# Altium schematic symbol library jlcpcb_2025_04_inductors_extended_0805.schlib: 882 symbols (part 1 of 5) (continued)
## BKW0805UCR39JGT
designator L?  Inductance: 390nH
Inductor, 390nH, ±5%, 1.5Ω, 290mA, SMD 0805; Manufacturer: FH-BK(Guangdong Fenghua Bangke Elec); Manufacturer Part Number: BKW0805UCR39JGT; Package Size: 0805; JLCPCB Basic Part: No; JLCPCB Part Number: C98544; Supplier 1: LCSC; Category: Inductors; Supplier Part Number 1: C98544; Tolerance: ±5%; Rated Current: 290mA; DC Resistance: 1.5Ω; RoHS: Yes; ComponentLink1Description: Datasheet; ComponentLink1URL: https://wmsc.lcsc.com/wmsc/upload/file/pdf/v2/lcsc/2304140030_FH-BK-Guangdong-Fenghua-Bangke-Elec-BKW0805UCR39JGT_C98544.pdf; ComponentLink2Description: JLCPCB Part URL; ComponentLink2URL: https://jlcpcb.com/partdetail/C98544; ComponentLink3Description: LCSC Part URL; ComponentLink3URL: https://lcsc.com/product-detail/Inductors-SMD_FH-BKGuangdong-Fenghua-Bangke-Elec-FH-BKGuangdong-Fenghua-Bangke-Elec-BKW0805UCR39JGT_C98544.html
footprint IND-0805 (0805 (2012M) Inductor)
pins: 1, 2

## BKW0805UCR47JGT
designator L?  Inductance: 470nH
Inductor, 470nH, ±5%, 2Ω, 250mA, SMD 0805; Manufacturer: FH-BK(Guangdong Fenghua Bangke Elec); Manufacturer Part Number: BKW0805UCR47JGT; Package Size: 0805; JLCPCB Basic Part: No; JLCPCB Part Number: C316239; Supplier 1: LCSC; Category: Inductors; Supplier Part Number 1: C316239; Tolerance: ±5%; Rated Current: 250mA; DC Resistance: 2Ω; RoHS: Yes; ComponentLink1Description: Datasheet; ComponentLink1URL: https://wmsc.lcsc.com/wmsc/upload/file/pdf/v2/lcsc/2304140030_FH-BK-Guangdong-Fenghua-Bangke-Elec-BKW0805UCR47JGT_C316239.pdf; ComponentLink2Description: JLCPCB Part URL; ComponentLink2URL: https://jlcpcb.com/partdetail/C316239; ComponentLink3Description: LCSC Part URL; ComponentLink3URL: https://lcsc.com/product-detail/Inductors-SMD_FH-BKGuangdong-Fenghua-Bangke-Elec-FH-BKGuangdong-Fenghua-Bangke-Elec-BKW0805UCR47JGT_C316239.html
footprint IND-0805 (0805 (2012M) Inductor)
pins: 1, 2

## BKW0805UCR56JGT
designator L?  Inductance: 560nH
Inductor, 560nH, ±5%, 1.9Ω, 230mA, SMD 0805; Manufacturer: FH-BK(Guangdong Fenghua Bangke Elec); Manufacturer Part Number: BKW0805UCR56JGT; Package Size: 0805; JLCPCB Basic Part: No; JLCPCB Part Number: C37297; Supplier 1: LCSC; Category: Inductors; Supplier Part Number 1: C37297; Tolerance: ±5%; Rated Current: 230mA; DC Resistance: 1.9Ω; RoHS: Yes; ComponentLink1Description: Datasheet; ComponentLink2Description: JLCPCB Part URL; ComponentLink2URL: https://jlcpcb.com/partdetail/C37297; ComponentLink3Description: LCSC Part URL; ComponentLink3URL: https://lcsc.com/product-detail/Inductors-SMD_FH-BKGuangdong-Fenghua-Bangke-Elec-FH-BKGuangdong-Fenghua-Bangke-Elec-BKW0805UCR56JGT_C37297.html
footprint IND-0805 (0805 (2012M) Inductor)
pins: 1, 2

## BKW0805UCR68JGT
designator L?  Inductance: 680nH
Inductor, 680nH, ±5%, 2.1Ω, 190mA, SMD 0805; Manufacturer: FH-BK(Guangdong Fenghua Bangke Elec); Manufacturer Part Number: BKW0805UCR68JGT; Package Size: 0805; JLCPCB Basic Part: No; JLCPCB Part Number: C361663; Supplier 1: LCSC; Category: Inductors; Supplier Part Number 1: C361663; Tolerance: ±5%; Rated Current: 190mA; DC Resistance: 2.1Ω; RoHS: Yes; ComponentLink1Description: Datasheet; ComponentLink1URL: https://wmsc.lcsc.com/wmsc/upload/file/pdf/v2/lcsc/2304140030_FH-BK-Guangdong-Fenghua-Bangke-Elec-BKW0805UCR68JGT_C361663.pdf; ComponentLink2Description: JLCPCB Part URL; ComponentLink2URL: https://jlcpcb.com/partdetail/C361663; ComponentLink3Description: LCSC Part URL; ComponentLink3URL: https://lcsc.com/product-detail/Inductors-SMD_FH-BKGuangdong-Fenghua-Bangke-Elec-FH-BKGuangdong-Fenghua-Bangke-Elec-BKW0805UCR68JGT_C361663.html
footprint IND-0805 (0805 (2012M) Inductor)
pins: 1, 2

## BKW0805UCR82JST
designator L?  Inductance: 820nH
Inductor, 820nH, ±5%, 180mA, SMD 0805; Manufacturer: FH-BK(Guangdong Fenghua Bangke Elec); Manufacturer Part Number: BKW0805UCR82JST; Package Size: 0805; JLCPCB Basic Part: No; JLCPCB Part Number: C243117; Supplier 1: LCSC; Category: Inductors; Supplier Part Number 1: C243117; Tolerance: ±5%; Rated Current: 180mA; RoHS: Yes; ComponentLink1Description: Datasheet; ComponentLink2Description: JLCPCB Part URL; ComponentLink2URL: https://jlcpcb.com/partdetail/C243117; ComponentLink3Description: LCSC Part URL; ComponentLink3URL: https://lcsc.com/product-detail/Inductors-SMD_FH-BKGuangdong-Fenghua-Bangke-Elec-FH-BKGuangdong-Fenghua-Bangke-Elec-BKW0805UCR82JST_C243117.html
footprint IND-0805 (0805 (2012M) Inductor)
pins: 1, 2

## BKW0805UF2R7KST
designator L?  Inductance: 2.7uH
Inductor, 2.7uH, ±10%, 1.7Ω, 320mA, SMD 0805; Manufacturer: FH-BK(Guangdong Fenghua Bangke Elec); Manufacturer Part Number: BKW0805UF2R7KST; Package Size: 0805; JLCPCB Basic Part: No; JLCPCB Part Number: C207574; Supplier 1: LCSC; Category: Inductors; Supplier Part Number 1: C207574; Tolerance: ±10%; Rated Current: 320mA; DC Resistance: 1.7Ω; RoHS: Yes; ComponentLink1Description: Datasheet; ComponentLink1URL: https://wmsc.lcsc.com/wmsc/upload/file/pdf/v2/lcsc/2304140030_FH-BK-Guangdong-Fenghua-Bangke-Elec-BKW0805UF2R7KST_C207574.pdf; ComponentLink2Description: JLCPCB Part URL; ComponentLink2URL: https://jlcpcb.com/partdetail/C207574; ComponentLink3Description: LCSC Part URL; ComponentLink3URL: https://lcsc.com/product-detail/Inductors-SMD_FH-BKGuangdong-Fenghua-Bangke-Elec-FH-BKGuangdong-Fenghua-Bangke-Elec-BKW0805UF2R7KST_C207574.html
footprint IND-0805 (0805 (2012M) Inductor)
pins: 1, 2

## BKW0805UF8R2KGT
designator L?  Inductance: 8.2uH
Inductor, 8.2uH, ±10%, 3Ω, 180mA, SMD 0805; Manufacturer: FH-BK(Guangdong Fenghua Bangke Elec); Manufacturer Part Number: BKW0805UF8R2KGT; Package Size: 0805; JLCPCB Basic Part: No; JLCPCB Part Number: C207573; Supplier 1: LCSC; Category: Inductors; Supplier Part Number 1: C207573; Tolerance: ±10%; Rated Current: 180mA; DC Resistance: 3Ω; RoHS: Yes; ComponentLink1Description: Datasheet; ComponentLink1URL: https://wmsc.lcsc.com/wmsc/upload/file/pdf/v2/lcsc/2304140030_FH-BK-Guangdong-Fenghua-Bangke-Elec-BKW0805UF8R2KGT_C207573.pdf; ComponentLink2Description: JLCPCB Part URL; ComponentLink2URL: https://jlcpcb.com/partdetail/C207573; ComponentLink3Description: LCSC Part URL; ComponentLink3URL: https://lcsc.com/product-detail/Inductors-SMD_FH-BKGuangdong-Fenghua-Bangke-Elec-FH-BKGuangdong-Fenghua-Bangke-Elec-BKW0805UF8R2KGT_C207573.html
footprint IND-0805 (0805 (2012M) Inductor)
pins: 1, 2

## BKW0805UF220KST
designator L?  Inductance: 22uH
Inductor, 22uH, ±10%, 6Ω, 80mA, SMD 0805; Manufacturer: FH-BK(Guangdong Fenghua Bangke Elec); Manufacturer Part Number: BKW0805UF220KST; Package Size: 0805; JLCPCB Basic Part: No; JLCPCB Part Number: C112609; Supplier 1: LCSC; Category: Inductors; Supplier Part Number 1: C112609; Tolerance: ±10%; Rated Current: 80mA; DC Resistance: 6Ω; RoHS: Yes; ComponentLink1Description: Datasheet; ComponentLink1URL: https://wmsc.lcsc.com/wmsc/upload/file/pdf/v2/lcsc/2304140030_FH-BK-Guangdong-Fenghua-Bangke-Elec-BKW0805UF220KST_C112609.pdf; ComponentLink2Description: JLCPCB Part URL; ComponentLink2URL: https://jlcpcb.com/partdetail/C112609; ComponentLink3Description: LCSC Part URL; ComponentLink3URL: https://lcsc.com/product-detail/Inductors-SMD_FH-BKGuangdong-Fenghua-Bangke-Elec-FH-BKGuangdong-Fenghua-Bangke-Elec-BKW0805UF220KST_C112609.html
footprint IND-0805 (0805 (2012M) Inductor)
pins: 1, 2

## BRL2012T1R0M
designator L?  Inductance: 1uH
Inductor, 1uH, ±20%, 175.5mΩ, 850mA, SMD 0805; Manufacturer: Taiyo Yuden; Manufacturer Part Number: BRL2012T1R0M; Package Size: 0805; JLCPCB Basic Part: No; JLCPCB Part Number: C92973; Supplier 1: LCSC; Category: Inductors; Supplier Part Number 1: C92973; Tolerance: ±20%; Rated Current: 850mA; DC Resistance: 175.5mΩ; RoHS: Yes; ComponentLink1Description: Datasheet; ComponentLink1URL: https://wmsc.lcsc.com/wmsc/upload/file/pdf/v2/lcsc/1810091458_Taiyo-Yuden-BRL2012T1R0M_C92973.pdf; ComponentLink2Description: JLCPCB Part URL; ComponentLink2URL: https://jlcpcb.com/partdetail/C92973; ComponentLink3Description: LCSC Part URL; ComponentLink3URL: https://lcsc.com/product-detail/Inductors-SMD_Taiyo-Yuden-Taiyo-Yuden-BRL2012T1R0M_C92973.html
footprint IND-0805 (0805 (2012M) Inductor)
pins: 1, 2

## BRL2012T4R7M
designator L?  Inductance: 4.7uH
Inductor, 4.7uH, ±20%, 715mΩ, 340mA, SMD 0805; Manufacturer: Taiyo Yuden; Manufacturer Part Number: BRL2012T4R7M; Self-Resonant Frequency: 150MHz; Package Size: 0805; JLCPCB Basic Part: No; JLCPCB Part Number: C92975; Supplier 1: LCSC; Category: Inductors; Supplier Part Number 1: C92975; Tolerance: ±20%; Rated Current: 340mA; Saturation Current: 340mA; DC Resistance: 715mΩ; RoHS: Yes; ComponentLink1Description: Datasheet; ComponentLink1URL: https://wmsc.lcsc.com/wmsc/upload/file/pdf/v2/lcsc/1810091458_Taiyo-Yuden-BRL2012T4R7M_C92975.pdf; ComponentLink2Description: JLCPCB Part URL; ComponentLink2URL: https://jlcpcb.com/partdetail/C92975; ComponentLink3Description: LCSC Part URL; ComponentLink3URL: https://lcsc.com/product-detail/Inductors-SMD_Taiyo-Yuden-Taiyo-Yuden-BRL2012T4R7M_C92975.html
footprint IND-0805 (0805 (2012M) Inductor)
pins: 1, 2

## BRL2012T100M
designator L?  Inductance: 10uH
Inductor, 10uH, ±20%, 1.105Ω, SMD 0805; Manufacturer: Taiyo Yuden; Manufacturer Part Number: BRL2012T100M; Saturation Current: 270mA; Package Size: 0805; JLCPCB Basic Part: No; JLCPCB Part Number: C92971; Supplier 1: LCSC; Category: Inductors; Supplier Part Number 1: C92971; Tolerance: ±20%; DC Resistance: 1.105Ω; RoHS: Yes; ComponentLink1Description: Datasheet; ComponentLink1URL: https://wmsc.lcsc.com/wmsc/upload/file/pdf/v2/lcsc/2201242300_Taiyo-Yuden-BRL2012T100M_C92971.pdf; ComponentLink2Description: JLCPCB Part URL; ComponentLink2URL: https://jlcpcb.com/partdetail/C92971; ComponentLink3Description: LCSC Part URL; ComponentLink3URL: https://lcsc.com/product-detail/Power-Inductors_Taiyo-Yuden-Taiyo-Yuden-BRL2012T100M_C92971.html
footprint IND-0805 (0805 (2012M) Inductor)
pins: 1, 2

## BRL2012T150M
designator L?  Inductance: 15uH
Inductor, 15uH, ±20%, 1.3Ω, 220mA, SMD 0805; Manufacturer: Taiyo Yuden; Manufacturer Part Number: BRL2012T150M; Self-Resonant Frequency: 15MHz; Package Size: 0805; JLCPCB Basic Part: No; JLCPCB Part Number: C92972; Supplier 1: LCSC; Category: Inductors; Supplier Part Number 1: C92972; Tolerance: ±20%; Rated Current: 220mA; Saturation Current: 220mA; DC Resistance: 1.3Ω; RoHS: Yes; ComponentLink1Description: Datasheet; ComponentLink1URL: https://wmsc.lcsc.com/wmsc/upload/file/pdf/v2/lcsc/1810091421_Taiyo-Yuden-BRL2012T150M_C92972.pdf; ComponentLink2Description: JLCPCB Part URL; ComponentLink2URL: https://jlcpcb.com/partdetail/C92972; ComponentLink3Description: LCSC Part URL; ComponentLink3URL: https://lcsc.com/product-detail/Inductors-SMD_Taiyo-Yuden-Taiyo-Yuden-BRL2012T150M_C92972.html
footprint IND-0805 (0805 (2012M) Inductor)
pins: 1, 2

## BRL2012TR47M
designator L?  Inductance: 470nH
Inductor, 470nH, ±20%, 90mΩ, 1.05A, SMD 0805; Manufacturer: Taiyo Yuden; Manufacturer Part Number: BRL2012TR47M; Saturation Current: 1.1A; Self-Resonant Frequency: 350MHz; Package Size: 0805; JLCPCB Basic Part: No; JLCPCB Part Number: C223135; Supplier 1: LCSC; Category: Inductors; Supplier Part Number 1: C223135; Tolerance: ±20%; Rated Current: 1.05A; DC Resistance: 90mΩ; RoHS: Yes; ComponentLink1Description: Datasheet; ComponentLink1URL: https://wmsc.lcsc.com/wmsc/upload/file/pdf/v2/lcsc/1912111437_Taiyo-Yuden-BRL2012TR47M_C223135.pdf; ComponentLink2Description: JLCPCB Part URL; ComponentLink2URL: https://jlcpcb.com/partdetail/C223135; ComponentLink3Description: LCSC Part URL; ComponentLink3URL: https://lcsc.com/product-detail/Inductors-SMD_Taiyo-Yuden-Taiyo-Yuden-BRL2012TR47M_C223135.html
footprint IND-0805 (0805 (2012M) Inductor)
pins: 1, 2

## CB2012T1R0M
designator L?  Inductance: 1uH
Inductor, 1uH, ±20%, 150mΩ, 500mA, SMD 0805; Manufacturer: Taiyo Yuden; Manufacturer Part Number: CB2012T1R0M; Self-Resonant Frequency: 100MHz; Package Size: 0805; JLCPCB Basic Part: No; JLCPCB Part Number: C223166; Supplier 1: LCSC; Category: Inductors; Supplier Part Number 1: C223166; Tolerance: ±20%; Rated Current: 500mA; Saturation Current: 500mA; DC Resistance: 150mΩ; RoHS: Yes; ComponentLink1Description: Datasheet; ComponentLink1URL: https://wmsc.lcsc.com/wmsc/upload/file/pdf/v2/lcsc/2304140030_Taiyo-Yuden-CB2012T1R0M_C223166.pdf; ComponentLink2Description: JLCPCB Part URL; ComponentLink2URL: https://jlcpcb.com/partdetail/C223166; ComponentLink3Description: LCSC Part URL; ComponentLink3URL: https://lcsc.com/product-detail/Inductors-SMD_Taiyo-Yuden-Taiyo-Yuden-CB2012T1R0M_C223166.html
footprint IND-0805 (0805 (2012M) Inductor)
pins: 1, 2

## CB2012T2R2M
designator L?  Inductance: 2.2uH
Inductor, 2.2uH, ±20%, 299mΩ, 410mA, SMD 0805; Manufacturer: Taiyo Yuden; Manufacturer Part Number: CB2012T2R2M; Package Size: 0805; JLCPCB Basic Part: No; JLCPCB Part Number: C90311; Supplier 1: LCSC; Category: Inductors; Supplier Part Number 1: C90311; Tolerance: ±20%; Rated Current: 410mA; DC Resistance: 299mΩ; RoHS: Yes; ComponentLink1Description: Datasheet; ComponentLink1URL: https://wmsc.lcsc.com/wmsc/upload/file/pdf/v2/lcsc/2304140030_Taiyo-Yuden-CB2012T2R2M_C90311.pdf; ComponentLink2Description: JLCPCB Part URL; ComponentLink2URL: https://jlcpcb.com/partdetail/C90311; ComponentLink3Description: LCSC Part URL; ComponentLink3URL: https://lcsc.com/product-detail/Inductors-SMD_Taiyo-Yuden-Taiyo-Yuden-CB2012T2R2M_C90311.html
footprint IND-0805 (0805 (2012M) Inductor)
pins: 1, 2

## CB2012T4R7M
designator L?  Inductance: 4.7uH
Inductor, 4.7uH, ±20%, 520mΩ, 300mA, SMD 0805; Manufacturer: Taiyo Yuden; Manufacturer Part Number: CB2012T4R7M; Package Size: 0805; JLCPCB Basic Part: No; JLCPCB Part Number: C90313; Supplier 1: LCSC; Category: Inductors; Supplier Part Number 1: C90313; Tolerance: ±20%; Rated Current: 300mA; DC Resistance: 520mΩ; RoHS: Yes; ComponentLink1Description: Datasheet; ComponentLink1URL: https://wmsc.lcsc.com/wmsc/upload/file/pdf/v2/lcsc/2304140030_Taiyo-Yuden-CB2012T4R7M_C90313.pdf; ComponentLink2Description: JLCPCB Part URL; ComponentLink2URL: https://jlcpcb.com/partdetail/C90313; ComponentLink3Description: LCSC Part URL; ComponentLink3URL: https://lcsc.com/product-detail/Inductors-SMD_Taiyo-Yuden-Taiyo-Yuden-CB2012T4R7M_C90313.html
footprint IND-0805 (0805 (2012M) Inductor)
pins: 1, 2

## CB2012T100M
designator L?  Inductance: 10uH
Inductor, 10uH, ±20%, 910mΩ, 190mA, SMD 0805; Manufacturer: Taiyo Yuden; Manufacturer Part Number: CB2012T100M; Package Size: 0805; JLCPCB Basic Part: No; JLCPCB Part Number: C90312; Supplier 1: LCSC; Category: Inductors; Supplier Part Number 1: C90312; Tolerance: ±20%; Rated Current: 190mA; DC Resistance: 910mΩ; RoHS: Yes; ComponentLink1Description: Datasheet; ComponentLink1URL: https://wmsc.lcsc.com/wmsc/upload/file/pdf/v2/lcsc/2304140030_Taiyo-Yuden-CB2012T100M_C90312.pdf; ComponentLink2Description: JLCPCB Part URL; ComponentLink2URL: https://jlcpcb.com/partdetail/C90312; ComponentLink3Description: LCSC Part URL; ComponentLink3URL: https://lcsc.com/product-detail/Inductors-SMD_Taiyo-Yuden-Taiyo-Yuden-CB2012T100M_C90312.html
footprint IND-0805 (0805 (2012M) Inductor)
pins: 1, 2

## CB2012T470M
designator L?  Inductance: 47uH
Inductor, 47uH, ±20%, 4.81Ω, 90mA, SMD 0805; Manufacturer: Taiyo Yuden; Manufacturer Part Number: CB2012T470M; Package Size: 0805; JLCPCB Basic Part: No; JLCPCB Part Number: C90314; Supplier 1: LCSC; Category: Inductors; Supplier Part Number 1: C90314; Tolerance: ±20%; Rated Current: 90mA; DC Resistance: 4.81Ω; RoHS: Yes; ComponentLink1Description: Datasheet; ComponentLink1URL: https://wmsc.lcsc.com/wmsc/upload/file/pdf/v2/lcsc/2304140030_Taiyo-Yuden-CB2012T470M_C90314.pdf; ComponentLink2Description: JLCPCB Part URL; ComponentLink2URL: https://jlcpcb.com/partdetail/C90314; ComponentLink3Description: LCSC Part URL; ComponentLink3URL: https://lcsc.com/product-detail/Inductors-SMD_Taiyo-Yuden-Taiyo-Yuden-CB2012T470M_C90314.html
footprint IND-0805 (0805 (2012M) Inductor)
pins: 1, 2

## CBC2012T1R0M
designator L?  Inductance: 1uH
Inductor, 1uH, ±20%, 247mΩ, 700mA, SMD 0805; Manufacturer: Taiyo Yuden; Manufacturer Part Number: CBC2012T1R0M; Package Size: 0805; JLCPCB Basic Part: No; JLCPCB Part Number: C92976; Supplier 1: LCSC; Category: Inductors; Supplier Part Number 1: C92976; Tolerance: ±20%; Rated Current: 700mA; DC Resistance: 247mΩ; RoHS: Yes; ComponentLink1Description: Datasheet; ComponentLink1URL: https://wmsc.lcsc.com/wmsc/upload/file/pdf/v2/lcsc/1810091458_Taiyo-Yuden-CBC2012T1R0M_C92976.pdf; ComponentLink2Description: JLCPCB Part URL; ComponentLink2URL: https://jlcpcb.com/partdetail/C92976; ComponentLink3Description: LCSC Part URL; ComponentLink3URL: https://lcsc.com/product-detail/Inductors-SMD_Taiyo-Yuden-Taiyo-Yuden-CBC2012T1R0M_C92976.html
footprint IND-0805 (0805 (2012M) Inductor)
pins: 1, 2

## CBC2012T4R7M
designator L?  Inductance: 4.7uH
Inductor, 4.7uH, ±20%, 650mΩ, 360mA, SMD 0805; Manufacturer: Taiyo Yuden; Manufacturer Part Number: CBC2012T4R7M; Self-Resonant Frequency: 45MHz; Package Size: 0805; JLCPCB Basic Part: No; JLCPCB Part Number: C92978; Supplier 1: LCSC; Category: Inductors; Supplier Part Number 1: C92978; Tolerance: ±20%; Rated Current: 360mA; Saturation Current: 360mA; DC Resistance: 650mΩ; RoHS: Yes; ComponentLink1Description: Datasheet; ComponentLink1URL: https://wmsc.lcsc.com/wmsc/upload/file/pdf/v2/lcsc/1810091458_Taiyo-Yuden-CBC2012T4R7M_C92978.pdf; ComponentLink2Description: JLCPCB Part URL; ComponentLink2URL: https://jlcpcb.com/partdetail/C92978; ComponentLink3Description: LCSC Part URL; ComponentLink3URL: https://lcsc.com/product-detail/Inductors-SMD_Taiyo-Yuden-Taiyo-Yuden-CBC2012T4R7M_C92978.html
footprint IND-0805 (0805 (2012M) Inductor)
pins: 1, 2

## CBC2012T220M
designator L?  Inductance: 22uH
Inductor, 22uH, ±20%, 4.81Ω, 170mA, SMD 0805; Manufacturer: Taiyo Yuden; Manufacturer Part Number: CBC2012T220M; Self-Resonant Frequency: 16MHz; Package Size: 0805; JLCPCB Basic Part: No; JLCPCB Part Number: C92977; Supplier 1: LCSC; Category: Inductors; Supplier Part Number 1: C92977; Tolerance: ±20%; Rated Current: 170mA; Saturation Current: 170mA; DC Resistance: 4.81Ω; RoHS: Yes; ComponentLink1Description: Datasheet; ComponentLink1URL: https://wmsc.lcsc.com/wmsc/upload/file/pdf/v2/lcsc/1810091421_Taiyo-Yuden-CBC2012T220M_C92977.pdf; ComponentLink2Description: JLCPCB Part URL; ComponentLink2URL: https://jlcpcb.com/partdetail/C92977; ComponentLink3Description: LCSC Part URL; ComponentLink3URL: https://lcsc.com/product-detail/Inductors-SMD_Taiyo-Yuden-Taiyo-Yuden-CBC2012T220M_C92977.html
footprint IND-0805 (0805 (2012M) Inductor)
pins: 1, 2

## CH2012H1N5S_f_
designator L?  Inductance: 1.5nH
Inductor, 1.5nH, 100mΩ, 600mA, SMD 0805; Manufacturer: CEC(Shenzhen Zhenhua Fu Elec); Manufacturer Part Number: CH2012H1N5S(f); Self-Resonant Frequency: 3GHz; Q Factor: 10@100MHz; Package Size: 0805; JLCPCB Basic Part: No; JLCPCB Part Number: C361695; Supplier 1: LCSC; Category: Inductors; Supplier Part Number 1: C361695; Rated Current: 600mA; DC Resistance: 100mΩ; RoHS: Yes; ComponentLink1Description: Datasheet; ComponentLink1URL: https://wmsc.lcsc.com/wmsc/upload/file/pdf/v2/lcsc/1912111437_CEC-Shenzhen-Zhenhua-Fu-Elec-CH2012H1N5S-f_C361695.pdf; ComponentLink2Description: JLCPCB Part URL; ComponentLink2URL: https://jlcpcb.com/partdetail/C361695; ComponentLink3Description: LCSC Part URL; ComponentLink3URL: https://lcsc.com/product-detail/Inductors-SMD_CECShenzhen-Zhenhua-Fu-Elec-CECShenzhen-Zhenhua-Fu-Elec-CH2012H1N5Sf_C361695.html
footprint IND-0805 (0805 (2012M) Inductor)
pins: 1, 2

## CH2012H1N8S_f_
designator L?  Inductance: 1.8nH
Inductor, 1.8nH, 100mΩ, 600mA, SMD 0805; Manufacturer: CEC(Shenzhen Zhenhua Fu Elec); Manufacturer Part Number: CH2012H1N8S(f); Self-Resonant Frequency: 3GHz; Q Factor: 10@100MHz; Package Size: 0805; JLCPCB Basic Part: No; JLCPCB Part Number: C316299; Supplier 1: LCSC; Category: Inductors; Supplier Part Number 1: C316299; Rated Current: 600mA; DC Resistance: 100mΩ; RoHS: Yes; ComponentLink1Description: Datasheet; ComponentLink1URL: https://wmsc.lcsc.com/wmsc/upload/file/pdf/v2/lcsc/2304140030_CEC-Shenzhen-Zhenhua-Fu-Elec-CH2012H1N8S-f_C316299.pdf; ComponentLink2Description: JLCPCB Part URL; ComponentLink2URL: https://jlcpcb.com/partdetail/C316299; ComponentLink3Description: LCSC Part URL; ComponentLink3URL: https://lcsc.com/product-detail/Inductors-SMD_CECShenzhen-Zhenhua-Fu-Elec-CECShenzhen-Zhenhua-Fu-Elec-CH2012H1N8Sf_C316299.html
footprint IND-0805 (0805 (2012M) Inductor)
pins: 1, 2

## CH2012H2N7S_f_
designator L?  Inductance: 2.7nH
Inductor, 2.7nH, 100mΩ, 600mA, SMD 0805; Manufacturer: CEC(Shenzhen Zhenhua Fu Elec); Manufacturer Part Number: CH2012H2N7S(f); Self-Resonant Frequency: 3GHz; Q Factor: 10@100MHz; Package Size: 0805; JLCPCB Basic Part: No; JLCPCB Part Number: C316296; Supplier 1: LCSC; Category: Inductors; Supplier Part Number 1: C316296; Rated Current: 600mA; DC Resistance: 100mΩ; RoHS: Yes; ComponentLink1Description: Datasheet; ComponentLink1URL: https://wmsc.lcsc.com/wmsc/upload/file/pdf/v2/lcsc/2304140030_CEC-Shenzhen-Zhenhua-Fu-Elec-CH2012H2N7S-f_C316296.pdf; ComponentLink2Description: JLCPCB Part URL; ComponentLink2URL: https://jlcpcb.com/partdetail/C316296; ComponentLink3Description: LCSC Part URL; ComponentLink3URL: https://lcsc.com/product-detail/Inductors-SMD_CECShenzhen-Zhenhua-Fu-Elec-CECShenzhen-Zhenhua-Fu-Elec-CH2012H2N7Sf_C316296.html
footprint IND-0805 (0805 (2012M) Inductor)
pins: 1, 2

## CH2012H3N3S_f_
designator L?  Inductance: 3.3nH
Inductor, 3.3nH, 130mΩ, 600mA, SMD 0805; Manufacturer: CEC(Shenzhen Zhenhua Fu Elec); Manufacturer Part Number: CH2012H3N3S(f); Self-Resonant Frequency: 3GHz; Q Factor: 10@100MHz; Package Size: 0805; JLCPCB Basic Part: No; JLCPCB Part Number: C316293; Supplier 1: LCSC; Category: Inductors; Supplier Part Number 1: C316293; Rated Current: 600mA; DC Resistance: 130mΩ; RoHS: Yes; ComponentLink1Description: Datasheet; ComponentLink1URL: https://wmsc.lcsc.com/wmsc/upload/file/pdf/v2/lcsc/2304140030_CEC-Shenzhen-Zhenhua-Fu-Elec-CH2012H3N3S-f_C316293.pdf; ComponentLink2Description: JLCPCB Part URL; ComponentLink2URL: https://jlcpcb.com/partdetail/C316293; ComponentLink3Description: LCSC Part URL; ComponentLink3URL: https://lcsc.com/product-detail/Inductors-SMD_CECShenzhen-Zhenhua-Fu-Elec-CECShenzhen-Zhenhua-Fu-Elec-CH2012H3N3Sf_C316293.html
footprint IND-0805 (0805 (2012M) Inductor)
pins: 1, 2

## CH2012H4N7S_f_
designator L?  Inductance: 4.7nH
Inductor, 4.7nH, 200mΩ, 400mA, SMD 0805; Manufacturer: CEC(Shenzhen Zhenhua Fu Elec); Manufacturer Part Number: CH2012H4N7S(f); Self-Resonant Frequency: 3GHz; Q Factor: 10@100MHz; Package Size: 0805; JLCPCB Basic Part: No; JLCPCB Part Number: C316290; Supplier 1: LCSC; Category: Inductors; Supplier Part Number 1: C316290; Rated Current: 400mA; DC Resistance: 200mΩ; RoHS: Yes; ComponentLink1Description: Datasheet; ComponentLink1URL: https://wmsc.lcsc.com/wmsc/upload/file/pdf/v2/lcsc/2304140030_CEC-Shenzhen-Zhenhua-Fu-Elec-CH2012H4N7S-f_C316290.pdf; ComponentLink2Description: JLCPCB Part URL; ComponentLink2URL: https://jlcpcb.com/partdetail/C316290; ComponentLink3Description: LCSC Part URL; ComponentLink3URL: https://lcsc.com/product-detail/Inductors-SMD_CECShenzhen-Zhenhua-Fu-Elec-CECShenzhen-Zhenhua-Fu-Elec-CH2012H4N7Sf_C316290.html
footprint IND-0805 (0805 (2012M) Inductor)
pins: 1, 2

## CH2012H5N6S_f_
designator L?  Inductance: 5.6nH
Inductor, 5.6nH, 230mΩ, 400mA, SMD 0805; Manufacturer: CEC(Shenzhen Zhenhua Fu Elec); Manufacturer Part Number: CH2012H5N6S(f); Self-Resonant Frequency: 3GHz; Q Factor: 10@100MHz; Package Size: 0805; JLCPCB Basic Part: No; JLCPCB Part Number: C316288; Supplier 1: LCSC; Category: Inductors; Supplier Part Number 1: C316288; Rated Current: 400mA; DC Resistance: 230mΩ; RoHS: Yes; ComponentLink1Description: Datasheet; ComponentLink1URL: https://wmsc.lcsc.com/wmsc/upload/file/pdf/v2/lcsc/2304140030_CEC-Shenzhen-Zhenhua-Fu-Elec-CH2012H5N6S-f_C316288.pdf; ComponentLink2Description: JLCPCB Part URL; ComponentLink2URL: https://jlcpcb.com/partdetail/C316288; ComponentLink3Description: LCSC Part URL; ComponentLink3URL: https://lcsc.com/product-detail/Inductors-SMD_CECShenzhen-Zhenhua-Fu-Elec-CECShenzhen-Zhenhua-Fu-Elec-CH2012H5N6Sf_C316288.html
footprint IND-0805 (0805 (2012M) Inductor)
pins: 1, 2

## CH2012H8N2J_f_
designator L?  Inductance: 8.2nH
Inductor, 8.2nH, ±5%, 280mΩ, 400mA, SMD 0805; Manufacturer: CEC(Shenzhen Zhenhua Fu Elec); Manufacturer Part Number: CH2012H8N2J(f); Self-Resonant Frequency: 3GHz; Q Factor: 10@100MHz; Package Size: 0805; JLCPCB Basic Part: No; JLCPCB Part Number: C316284; Supplier 1: LCSC; Category: Inductors; Supplier Part Number 1: C316284; Tolerance: ±5%; Rated Current: 400mA; DC Resistance: 280mΩ; RoHS: Yes; ComponentLink1Description: Datasheet; ComponentLink1URL: https://wmsc.lcsc.com/wmsc/upload/file/pdf/v2/lcsc/2304140030_CEC-Shenzhen-Zhenhua-Fu-Elec-CH2012H8N2J-f_C316284.pdf; ComponentLink2Description: JLCPCB Part URL; ComponentLink2URL: https://jlcpcb.com/partdetail/C316284; ComponentLink3Description: LCSC Part URL; ComponentLink3URL: https://lcsc.com/product-detail/Inductors-SMD_CECShenzhen-Zhenhua-Fu-Elec-CECShenzhen-Zhenhua-Fu-Elec-CH2012H8N2Jf_C316284.html
footprint IND-0805 (0805 (2012M) Inductor)
pins: 1, 2

## CH2012H12NJ_f_
designator L?  Inductance: 12nH
Inductor, 12nH, ±5%, 300mΩ, 300mA, SMD 0805; Manufacturer: CEC(Shenzhen Zhenhua Fu Elec); Manufacturer Part Number: CH2012H12NJ(f); Self-Resonant Frequency: 2.45GHz; Q Factor: 10@100MHz; Package Size: 0805; JLCPCB Basic Part: No; JLCPCB Part Number: C361689; Supplier 1: LCSC; Category: Inductors; Supplier Part Number 1: C361689; Tolerance: ±5%; Rated Current: 300mA; DC Resistance: 300mΩ; RoHS: Yes; ComponentLink1Description: Datasheet; ComponentLink1URL: https://wmsc.lcsc.com/wmsc/upload/file/pdf/v2/lcsc/2304140030_CEC-Shenzhen-Zhenhua-Fu-Elec-CH2012H12NJ-f_C361689.pdf; ComponentLink2Description: JLCPCB Part URL; ComponentLink2URL: https://jlcpcb.com/partdetail/C361689; ComponentLink3Description: LCSC Part URL; ComponentLink3URL: https://lcsc.com/product-detail/Inductors-SMD_CECShenzhen-Zhenhua-Fu-Elec-CECShenzhen-Zhenhua-Fu-Elec-CH2012H12NJf_C361689.html
footprint IND-0805 (0805 (2012M) Inductor)
pins: 1, 2

## CH2012H68NJ_f_
designator L?  Inductance: 68nH
Inductor, 68nH, ±5%, 800mΩ, 300mA, SMD 0805; Manufacturer: CEC(Shenzhen Zhenhua Fu Elec); Manufacturer Part Number: CH2012H68NJ(f); Self-Resonant Frequency: 1GHz; Q Factor: 15@100MHz; Package Size: 0805; JLCPCB Basic Part: No; JLCPCB Part Number: C316287; Supplier 1: LCSC; Category: Inductors; Supplier Part Number 1: C316287; Tolerance: ±5%; Rated Current: 300mA; DC Resistance: 800mΩ; RoHS: Yes; ComponentLink1Description: Datasheet; ComponentLink1URL: https://wmsc.lcsc.com/wmsc/upload/file/pdf/v2/lcsc/2304140030_CEC-Shenzhen-Zhenhua-Fu-Elec-CH2012H68NJ-f_C316287.pdf; ComponentLink2Description: JLCPCB Part URL; ComponentLink2URL: https://jlcpcb.com/partdetail/C316287; ComponentLink3Description: LCSC Part URL; ComponentLink3URL: https://lcsc.com/product-detail/Inductors-SMD_CECShenzhen-Zhenhua-Fu-Elec-CECShenzhen-Zhenhua-Fu-Elec-CH2012H68NJf_C316287.html
footprint IND-0805 (0805 (2012M) Inductor)
pins: 1, 2

## CI2012AR12K
designator L?  Inductance: 120nH
Inductor, 120nH, ±10%, 300mΩ, 250mA, SMD 0805; Manufacturer: CEC(Shenzhen Zhenhua Fu Elec); Manufacturer Part Number: CI2012AR12K; Self-Resonant Frequency: 220MHz; Q Factor: 20@25MHz; Package Size: 0805; JLCPCB Basic Part: No; JLCPCB Part Number: C107518; Supplier 1: LCSC; Category: Inductors; Supplier Part Number 1: C107518; Tolerance: ±10%; Rated Current: 250mA; DC Resistance: 300mΩ; RoHS: Yes; ComponentLink1Description: Datasheet; ComponentLink1URL: https://wmsc.lcsc.com/wmsc/upload/file/pdf/v2/lcsc/2304140030_CEC-Shenzhen-Zhenhua-Fu-Elec-CI2012AR12K_C107518.pdf; ComponentLink2Description: JLCPCB Part URL; ComponentLink2URL: https://jlcpcb.com/partdetail/C107518; ComponentLink3Description: LCSC Part URL; ComponentLink3URL: https://lcsc.com/product-detail/Inductors-SMD_CECShenzhen-Zhenhua-Fu-Elec-CECShenzhen-Zhenhua-Fu-Elec-CI2012AR12K_C107518.html
footprint IND-0805 (0805 (2012M) Inductor)
pins: 1, 2

## CI2012AR18K
designator L?  Inductance: 180nH
Inductor, 180nH, ±10%, 400mΩ, 250mA, SMD 0805; Manufacturer: CEC(Shenzhen Zhenhua Fu Elec); Manufacturer Part Number: CI2012AR18K; Self-Resonant Frequency: 185MHz; Q Factor: 20@25MHz; Package Size: 0805; JLCPCB Basic Part: No; JLCPCB Part Number: C107520; Supplier 1: LCSC; Category: Inductors; Supplier Part Number 1: C107520; Tolerance: ±10%; Rated Current: 250mA; DC Resistance: 400mΩ; RoHS: Yes; ComponentLink1Description: Datasheet; ComponentLink1URL: https://wmsc.lcsc.com/wmsc/upload/file/pdf/v2/lcsc/2304140030_CEC-Shenzhen-Zhenhua-Fu-Elec-CI2012AR18K_C107520.pdf; ComponentLink2Description: JLCPCB Part URL; ComponentLink2URL: https://jlcpcb.com/partdetail/C107520; ComponentLink3Description: LCSC Part URL; ComponentLink3URL: https://lcsc.com/product-detail/Inductors-SMD_CECShenzhen-Zhenhua-Fu-Elec-CECShenzhen-Zhenhua-Fu-Elec-CI2012AR18K_C107520.html
footprint IND-0805 (0805 (2012M) Inductor)
pins: 1, 2

## CI2012AR22K
designator L?  Inductance: 220nH
Inductor, 220nH, ±10%, 500mΩ, 250mA, SMD 0805; Manufacturer: CEC(Shenzhen Zhenhua Fu Elec); Manufacturer Part Number: CI2012AR22K; Self-Resonant Frequency: 170MHz; Q Factor: 20@25MHz; Package Size: 0805; JLCPCB Basic Part: No; JLCPCB Part Number: C107521; Supplier 1: LCSC; Category: Inductors; Supplier Part Number 1: C107521; Tolerance: ±10%; Rated Current: 250mA; DC Resistance: 500mΩ; RoHS: Yes; ComponentLink1Description: Datasheet; ComponentLink1URL: https://wmsc.lcsc.com/wmsc/upload/file/pdf/v2/lcsc/2304140030_CEC-Shenzhen-Zhenhua-Fu-Elec-CI2012AR22K_C107521.pdf; ComponentLink2Description: JLCPCB Part URL; ComponentLink2URL: https://jlcpcb.com/partdetail/C107521; ComponentLink3Description: LCSC Part URL; ComponentLink3URL: https://lcsc.com/product-detail/Inductors-SMD_CECShenzhen-Zhenhua-Fu-Elec-CECShenzhen-Zhenhua-Fu-Elec-CI2012AR22K_C107521.html
footprint IND-0805 (0805 (2012M) Inductor)
pins: 1, 2

## CI2012AR27K
designator L?  Inductance: 270nH
Inductor, 270nH, ±10%, 500mΩ, 250mA, SMD 0805; Manufacturer: CEC(Shenzhen Zhenhua Fu Elec); Manufacturer Part Number: CI2012AR27K; Self-Resonant Frequency: 150MHz; Q Factor: 20@25MHz; Package Size: 0805; JLCPCB Basic Part: No; JLCPCB Part Number: C107522; Supplier 1: LCSC; Category: Inductors; Supplier Part Number 1: C107522; Tolerance: ±10%; Rated Current: 250mA; DC Resistance: 500mΩ; RoHS: Yes; ComponentLink1Description: Datasheet; ComponentLink1URL: https://wmsc.lcsc.com/wmsc/upload/file/pdf/v2/lcsc/2304140030_CEC-Shenzhen-Zhenhua-Fu-Elec-CI2012AR27K_C107522.pdf; ComponentLink2Description: JLCPCB Part URL; ComponentLink2URL: https://jlcpcb.com/partdetail/C107522; ComponentLink3Description: LCSC Part URL; ComponentLink3URL: https://lcsc.com/product-detail/Inductors-SMD_CECShenzhen-Zhenhua-Fu-Elec-CECShenzhen-Zhenhua-Fu-Elec-CI2012AR27K_C107522.html
footprint IND-0805 (0805 (2012M) Inductor)
pins: 1, 2

## CI2012AR82K_f_
designator L?  Inductance: 820nH
Inductor, 820nH, ±10%, 1Ω, 150mA, SMD 0805; Manufacturer: CEC(Shenzhen Zhenhua Fu Elec); Manufacturer Part Number: CI2012AR82K(f); Self-Resonant Frequency: 100MHz; Q Factor: 25@25MHz; Package Size: 0805; JLCPCB Basic Part: No; JLCPCB Part Number: C316283; Supplier 1: LCSC; Category: Inductors; Supplier Part Number 1: C316283; Tolerance: ±10%; Rated Current: 150mA; DC Resistance: 1Ω; RoHS: Yes; ComponentLink1Description: Datasheet; ComponentLink1URL: https://wmsc.lcsc.com/wmsc/upload/file/pdf/v2/lcsc/1811081110_CEC-Shenzhen-Zhenhua-Fu-Elec-CI2012AR82K-f_C316283.pdf; ComponentLink2Description: JLCPCB Part URL; ComponentLink2URL: https://jlcpcb.com/partdetail/C316283; ComponentLink3Description: LCSC Part URL; ComponentLink3URL: https://lcsc.com/product-detail/Inductors-SMD_CECShenzhen-Zhenhua-Fu-Elec-CECShenzhen-Zhenhua-Fu-Elec-CI2012AR82Kf_C316283.html
footprint IND-0805 (0805 (2012M) Inductor)
pins: 1, 2

## CI2012B1R2K
designator L?  Inductance: 1.2uH
Inductor, 1.2uH, ±10%, 500mΩ, 50mA, SMD 0805; Manufacturer: CEC(Shenzhen Zhenhua Fu Elec); Manufacturer Part Number: CI2012B1R2K; Self-Resonant Frequency: 65MHz; Q Factor: 45@10MHz; Package Size: 0805; JLCPCB Basic Part: No; JLCPCB Part Number: C107530; Supplier 1: LCSC; Category: Inductors; Supplier Part Number 1: C107530; Tolerance: ±10%; Rated Current: 50mA; DC Resistance: 500mΩ; RoHS: Yes; ComponentLink1Description: Datasheet; ComponentLink1URL: https://wmsc.lcsc.com/wmsc/upload/file/pdf/v2/lcsc/2304140030_CEC-Shenzhen-Zhenhua-Fu-Elec-CI2012B1R2K_C107530.pdf; ComponentLink2Description: JLCPCB Part URL; ComponentLink2URL: https://jlcpcb.com/partdetail/C107530; ComponentLink3Description: LCSC Part URL; ComponentLink3URL: https://lcsc.com/product-detail/Inductors-SMD_CECShenzhen-Zhenhua-Fu-Elec-CECShenzhen-Zhenhua-Fu-Elec-CI2012B1R2K_C107530.html
footprint IND-0805 (0805 (2012M) Inductor)
pins: 1, 2

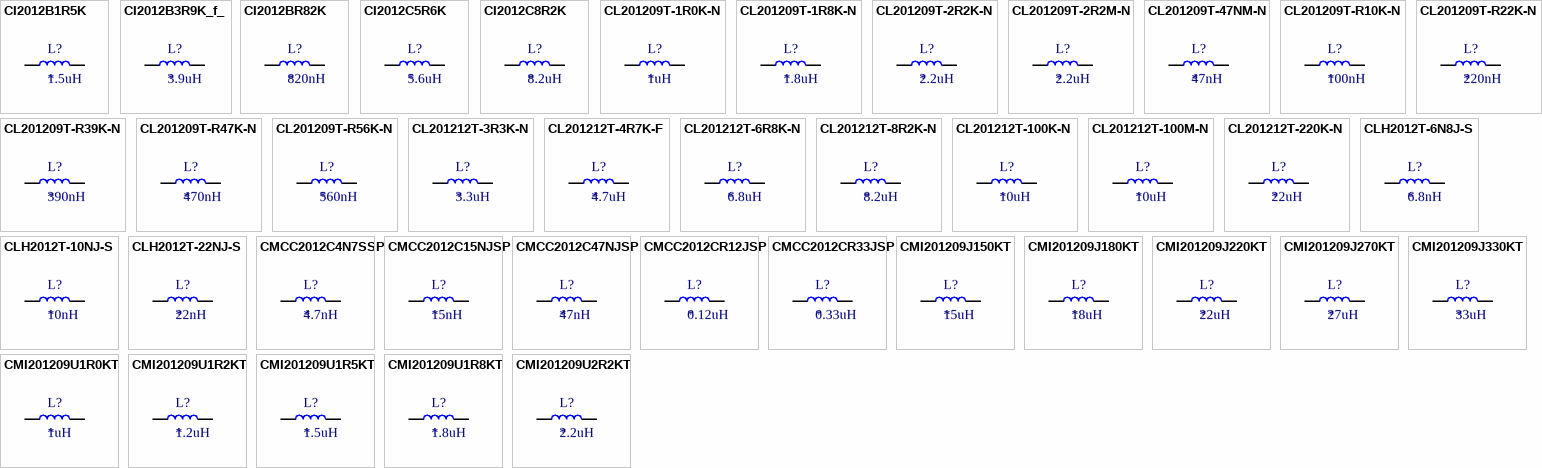
[diagram p2: symbols CI2012B1R5K to CMI201209U2R2KT]

## CI2012B1R5K
designator L?  Inductance: 1.5uH
Inductor, 1.5uH, ±10%, 500mΩ, 50mA, SMD 0805; Manufacturer: CEC(Shenzhen Zhenhua Fu Elec); Manufacturer Part Number: CI2012B1R5K; Self-Resonant Frequency: 60MHz; Q Factor: 45@10MHz; Package Size: 0805; JLCPCB Basic Part: No; JLCPCB Part Number: C107531; Supplier 1: LCSC; Category: Inductors; Supplier Part Number 1: C107531; Tolerance: ±10%; Rated Current: 50mA; DC Resistance: 500mΩ; RoHS: Yes; ComponentLink1Description: Datasheet; ComponentLink1URL: https://wmsc.lcsc.com/wmsc/upload/file/pdf/v2/lcsc/2304140030_CEC-Shenzhen-Zhenhua-Fu-Elec-CI2012B1R5K_C107531.pdf; ComponentLink2Description: JLCPCB Part URL; ComponentLink2URL: https://jlcpcb.com/partdetail/C107531; ComponentLink3Description: LCSC Part URL; ComponentLink3URL: https://lcsc.com/product-detail/Inductors-SMD_CECShenzhen-Zhenhua-Fu-Elec-CECShenzhen-Zhenhua-Fu-Elec-CI2012B1R5K_C107531.html
footprint IND-0805 (0805 (2012M) Inductor)
pins: 1, 2

## CI2012B3R9K_f_
designator L?  Inductance: 3.9uH
Inductor, 3.9uH, ±10%, 900mΩ, 30mA, SMD 0805; Manufacturer: CEC(Shenzhen Zhenhua Fu Elec); Manufacturer Part Number: CI2012B3R9K(f); Self-Resonant Frequency: 38MHz; Q Factor: 45@10MHz; Package Size: 0805; JLCPCB Basic Part: No; JLCPCB Part Number: C107536; Supplier 1: LCSC; Category: Inductors; Supplier Part Number 1: C107536; Tolerance: ±10%; Rated Current: 30mA; DC Resistance: 900mΩ; RoHS: Yes; ComponentLink1Description: Datasheet; ComponentLink1URL: https://wmsc.lcsc.com/wmsc/upload/file/pdf/v2/lcsc/2304140030_CEC-Shenzhen-Zhenhua-Fu-Elec-CI2012B3R9K-f_C107536.pdf; ComponentLink2Description: JLCPCB Part URL; ComponentLink2URL: https://jlcpcb.com/partdetail/C107536; ComponentLink3Description: LCSC Part URL; ComponentLink3URL: https://lcsc.com/product-detail/Inductors-SMD_CECShenzhen-Zhenhua-Fu-Elec-CECShenzhen-Zhenhua-Fu-Elec-CI2012B3R9Kf_C107536.html
footprint IND-0805 (0805 (2012M) Inductor)
pins: 1, 2

## CI2012BR82K
designator L?  Inductance: 820nH
Inductor, 820nH, ±10%, 1Ω, 150mA, SMD 0805; Manufacturer: CEC(Shenzhen Zhenhua Fu Elec); Manufacturer Part Number: CI2012BR82K; Self-Resonant Frequency: 25MHz; Q Factor: 25@25MHz; Package Size: 0805; JLCPCB Basic Part: No; JLCPCB Part Number: C107528; Supplier 1: LCSC; Category: Inductors; Supplier Part Number 1: C107528; Tolerance: ±10%; Rated Current: 150mA; DC Resistance: 1Ω; RoHS: Yes; ComponentLink1Description: Datasheet; ComponentLink1URL: https://wmsc.lcsc.com/wmsc/upload/file/pdf/v2/lcsc/1810191413_CEC-Shenzhen-Zhenhua-Fu-Elec-CI2012BR82K_C107528.pdf; ComponentLink2Description: JLCPCB Part URL; ComponentLink2URL: https://jlcpcb.com/partdetail/C107528; ComponentLink3Description: LCSC Part URL; ComponentLink3URL: https://lcsc.com/product-detail/Inductors-SMD_CECShenzhen-Zhenhua-Fu-Elec-CECShenzhen-Zhenhua-Fu-Elec-CI2012BR82K_C107528.html
footprint IND-0805 (0805 (2012M) Inductor)
pins: 1, 2

## CI2012C5R6K
designator L?  Inductance: 5.6uH
Inductor, 5.6uH, ±10%, 900mΩ, 15mA, SMD 0805; Manufacturer: CEC(Shenzhen Zhenhua Fu Elec); Manufacturer Part Number: CI2012C5R6K; Self-Resonant Frequency: 32MHz; Q Factor: 50@4MHz; Package Size: 0805; JLCPCB Basic Part: No; JLCPCB Part Number: C107538; Supplier 1: LCSC; Category: Inductors; Supplier Part Number 1: C107538; Tolerance: ±10%; Rated Current: 15mA; DC Resistance: 900mΩ; RoHS: Yes; ComponentLink1Description: Datasheet; ComponentLink1URL: https://wmsc.lcsc.com/wmsc/upload/file/pdf/v2/lcsc/2304140030_CEC-Shenzhen-Zhenhua-Fu-Elec-CI2012C5R6K_C107538.pdf; ComponentLink2Description: JLCPCB Part URL; ComponentLink2URL: https://jlcpcb.com/partdetail/C107538; ComponentLink3Description: LCSC Part URL; ComponentLink3URL: https://lcsc.com/product-detail/Inductors-SMD_CECShenzhen-Zhenhua-Fu-Elec-CECShenzhen-Zhenhua-Fu-Elec-CI2012C5R6K_C107538.html
footprint IND-0805 (0805 (2012M) Inductor)
pins: 1, 2

## CI2012C8R2K
designator L?  Inductance: 8.2uH
Inductor, 8.2uH, ±10%, 1.1Ω, 15mA, SMD 0805; Manufacturer: CEC(Shenzhen Zhenhua Fu Elec); Manufacturer Part Number: CI2012C8R2K; Self-Resonant Frequency: 26MHz; Q Factor: 50@4MHz; Package Size: 0805; JLCPCB Basic Part: No; JLCPCB Part Number: C107540; Supplier 1: LCSC; Category: Inductors; Supplier Part Number 1: C107540; Tolerance: ±10%; Rated Current: 15mA; DC Resistance: 1.1Ω; RoHS: Yes; ComponentLink1Description: Datasheet; ComponentLink1URL: https://wmsc.lcsc.com/wmsc/upload/file/pdf/v2/lcsc/2304140030_CEC-Shenzhen-Zhenhua-Fu-Elec-CI2012C8R2K_C107540.pdf; ComponentLink2Description: JLCPCB Part URL; ComponentLink2URL: https://jlcpcb.com/partdetail/C107540; ComponentLink3Description: LCSC Part URL; ComponentLink3URL: https://lcsc.com/product-detail/Inductors-SMD_CECShenzhen-Zhenhua-Fu-Elec-CECShenzhen-Zhenhua-Fu-Elec-CI2012C8R2K_C107540.html
footprint IND-0805 (0805 (2012M) Inductor)
pins: 1, 2

## CL201209T-1R0K-N
designator L?  Inductance: 1uH
Inductor, 1uH, ±10%, 400mΩ, 50mA, SMD 0805; Manufacturer: Chilisin Elec; Manufacturer Part Number: CL201209T-1R0K-N; Self-Resonant Frequency: 75MHz; Q Factor: 45@10MHz; Package Size: 0805; JLCPCB Basic Part: No; JLCPCB Part Number: C285985; Supplier 1: LCSC; Category: Inductors; Supplier Part Number 1: C285985; Tolerance: ±10%; Rated Current: 50mA; DC Resistance: 400mΩ; RoHS: Yes; ComponentLink1Description: Datasheet; ComponentLink1URL: https://wmsc.lcsc.com/wmsc/upload/file/pdf/v2/lcsc/1811121630_Chilisin-Elec-CL201209T-1R0K-N_C285985.pdf; ComponentLink2Description: JLCPCB Part URL; ComponentLink2URL: https://jlcpcb.com/partdetail/C285985; ComponentLink3Description: LCSC Part URL; ComponentLink3URL: https://lcsc.com/product-detail/Inductors-SMD_Chilisin-Elec-Chilisin-Elec-CL201209T-1R0K-N_C285985.html
footprint IND-0805 (0805 (2012M) Inductor)
pins: 1, 2

## CL201209T-1R8K-N
designator L?  Inductance: 1.8uH
Inductor, 1.8uH, ±10%, 600mΩ, 50mA, SMD 0805; Manufacturer: Chilisin Elec; Manufacturer Part Number: CL201209T-1R8K-N; Self-Resonant Frequency: 55MHz; Q Factor: 45@10MHz; Package Size: 0805; JLCPCB Basic Part: No; JLCPCB Part Number: C142268; Supplier 1: LCSC; Category: Inductors; Supplier Part Number 1: C142268; Tolerance: ±10%; Rated Current: 50mA; DC Resistance: 600mΩ; RoHS: Yes; ComponentLink1Description: Datasheet; ComponentLink1URL: https://wmsc.lcsc.com/wmsc/upload/file/pdf/v2/lcsc/2304140030_Chilisin-Elec-CL201209T-1R8K-N_C142268.pdf; ComponentLink2Description: JLCPCB Part URL; ComponentLink2URL: https://jlcpcb.com/partdetail/C142268; ComponentLink3Description: LCSC Part URL; ComponentLink3URL: https://lcsc.com/product-detail/Inductors-SMD_Chilisin-Elec-Chilisin-Elec-CL201209T-1R8K-N_C142268.html
footprint IND-0805 (0805 (2012M) Inductor)
pins: 1, 2

## CL201209T-2R2K-N
designator L?  Inductance: 2.2uH
Inductor, 2.2uH, ±10%, 650mΩ, 30mA, SMD 0805; Manufacturer: Chilisin Elec; Manufacturer Part Number: CL201209T-2R2K-N; Self-Resonant Frequency: 50MHz; Q Factor: 45@10MHz; Package Size: 0805; JLCPCB Basic Part: No; JLCPCB Part Number: C142267; Supplier 1: LCSC; Category: Inductors; Supplier Part Number 1: C142267; Tolerance: ±10%; Rated Current: 30mA; DC Resistance: 650mΩ; RoHS: Yes; ComponentLink1Description: Datasheet; ComponentLink1URL: https://wmsc.lcsc.com/wmsc/upload/file/pdf/v2/lcsc/2304140030_Chilisin-Elec-CL201209T-2R2K-N_C142267.pdf; ComponentLink2Description: JLCPCB Part URL; ComponentLink2URL: https://jlcpcb.com/partdetail/C142267; ComponentLink3Description: LCSC Part URL; ComponentLink3URL: https://lcsc.com/product-detail/Inductors-SMD_Chilisin-Elec-Chilisin-Elec-CL201209T-2R2K-N_C142267.html
footprint IND-0805 (0805 (2012M) Inductor)
pins: 1, 2

## CL201209T-2R2M-N
designator L?  Inductance: 2.2uH
Inductor, 2.2uH, ±20%, 650mΩ, 30mA, SMD 0805; Manufacturer: Chilisin Elec; Manufacturer Part Number: CL201209T-2R2M-N; Self-Resonant Frequency: 50MHz; Q Factor: 45@10MHz; Package Size: 0805; JLCPCB Basic Part: No; JLCPCB Part Number: C285984; Supplier 1: LCSC; Category: Inductors; Supplier Part Number 1: C285984; Tolerance: ±20%; Rated Current: 30mA; DC Resistance: 650mΩ; RoHS: Yes; ComponentLink1Description: Datasheet; ComponentLink1URL: https://wmsc.lcsc.com/wmsc/upload/file/pdf/v2/lcsc/2304140030_Chilisin-Elec-CL201209T-2R2M-N_C285984.pdf; ComponentLink2Description: JLCPCB Part URL; ComponentLink2URL: https://jlcpcb.com/partdetail/C285984; ComponentLink3Description: LCSC Part URL; ComponentLink3URL: https://lcsc.com/product-detail/Inductors-SMD_Chilisin-Elec-Chilisin-Elec-CL201209T-2R2M-N_C285984.html
footprint IND-0805 (0805 (2012M) Inductor)
pins: 1, 2

## CL201209T-47NM-N
designator L?  Inductance: 47nH
Inductor, 47nH, ±20%, 200mΩ, 300mA, SMD 0805; Manufacturer: Chilisin Elec; Manufacturer Part Number: CL201209T-47NM-N; Self-Resonant Frequency: 320MHz; Q Factor: 20@50MHz; Package Size: 0805; JLCPCB Basic Part: No; JLCPCB Part Number: C285983; Supplier 1: LCSC; Category: Inductors; Supplier Part Number 1: C285983; Tolerance: ±20%; Rated Current: 300mA; DC Resistance: 200mΩ; RoHS: Yes; ComponentLink1Description: Datasheet; ComponentLink1URL: https://wmsc.lcsc.com/wmsc/upload/file/pdf/v2/lcsc/1811121621_Chilisin-Elec-CL201209T-47NM-N_C285983.pdf; ComponentLink2Description: JLCPCB Part URL; ComponentLink2URL: https://jlcpcb.com/partdetail/C285983; ComponentLink3Description: LCSC Part URL; ComponentLink3URL: https://lcsc.com/product-detail/Inductors-SMD_Chilisin-Elec-Chilisin-Elec-CL201209T-47NM-N_C285983.html
footprint IND-0805 (0805 (2012M) Inductor)
pins: 1, 2

## CL201209T-R10K-N
designator L?  Inductance: 100nH
Inductor, 100nH, ±10%, 300mΩ, 250mA, SMD 0805; Manufacturer: Chilisin Elec; Manufacturer Part Number: CL201209T-R10K-N; Self-Resonant Frequency: 235MHz; Q Factor: 25@25MHz; Package Size: 0805; JLCPCB Basic Part: No; JLCPCB Part Number: C285982; Supplier 1: LCSC; Category: Inductors; Supplier Part Number 1: C285982; Tolerance: ±10%; Rated Current: 250mA; DC Resistance: 300mΩ; RoHS: Yes; ComponentLink1Description: Datasheet; ComponentLink1URL: https://wmsc.lcsc.com/wmsc/upload/file/pdf/v2/lcsc/2304140030_Chilisin-Elec-CL201209T-R10K-N_C285982.pdf; ComponentLink2Description: JLCPCB Part URL; ComponentLink2URL: https://jlcpcb.com/partdetail/C285982; ComponentLink3Description: LCSC Part URL; ComponentLink3URL: https://lcsc.com/product-detail/Inductors-SMD_Chilisin-Elec-Chilisin-Elec-CL201209T-R10K-N_C285982.html
footprint IND-0805 (0805 (2012M) Inductor)
pins: 1, 2

## CL201209T-R22K-N
designator L?  Inductance: 220nH
Inductor, 220nH, ±10%, 500mΩ, 250mA, SMD 0805; Manufacturer: Chilisin Elec; Manufacturer Part Number: CL201209T-R22K-N; Self-Resonant Frequency: 170MHz; Q Factor: 25@25MHz; Package Size: 0805; JLCPCB Basic Part: No; JLCPCB Part Number: C142265; Supplier 1: LCSC; Category: Inductors; Supplier Part Number 1: C142265; Tolerance: ±10%; Rated Current: 250mA; DC Resistance: 500mΩ; RoHS: Yes; ComponentLink1Description: Datasheet; ComponentLink1URL: https://wmsc.lcsc.com/wmsc/upload/file/pdf/v2/lcsc/2304140030_Chilisin-Elec-CL201209T-R22K-N_C142265.pdf; ComponentLink2Description: JLCPCB Part URL; ComponentLink2URL: https://jlcpcb.com/partdetail/C142265; ComponentLink3Description: LCSC Part URL; ComponentLink3URL: https://lcsc.com/product-detail/Inductors-SMD_Chilisin-Elec-Chilisin-Elec-CL201209T-R22K-N_C142265.html
footprint IND-0805 (0805 (2012M) Inductor)
pins: 1, 2